# Altium footprint library goldpin_pcb.PcbLib: 235 footprints (part 7 of 15)
Each footprint in its own frame and in the unit in brackets; x right, y up, seen from the top. Pads: shape width x height; smd on the part's side, far side on the other; paste and mask are expansions set on the pad; w line width, h text height; cw(c..) or ccw(c..) is an arc to the next point about the centre after c.
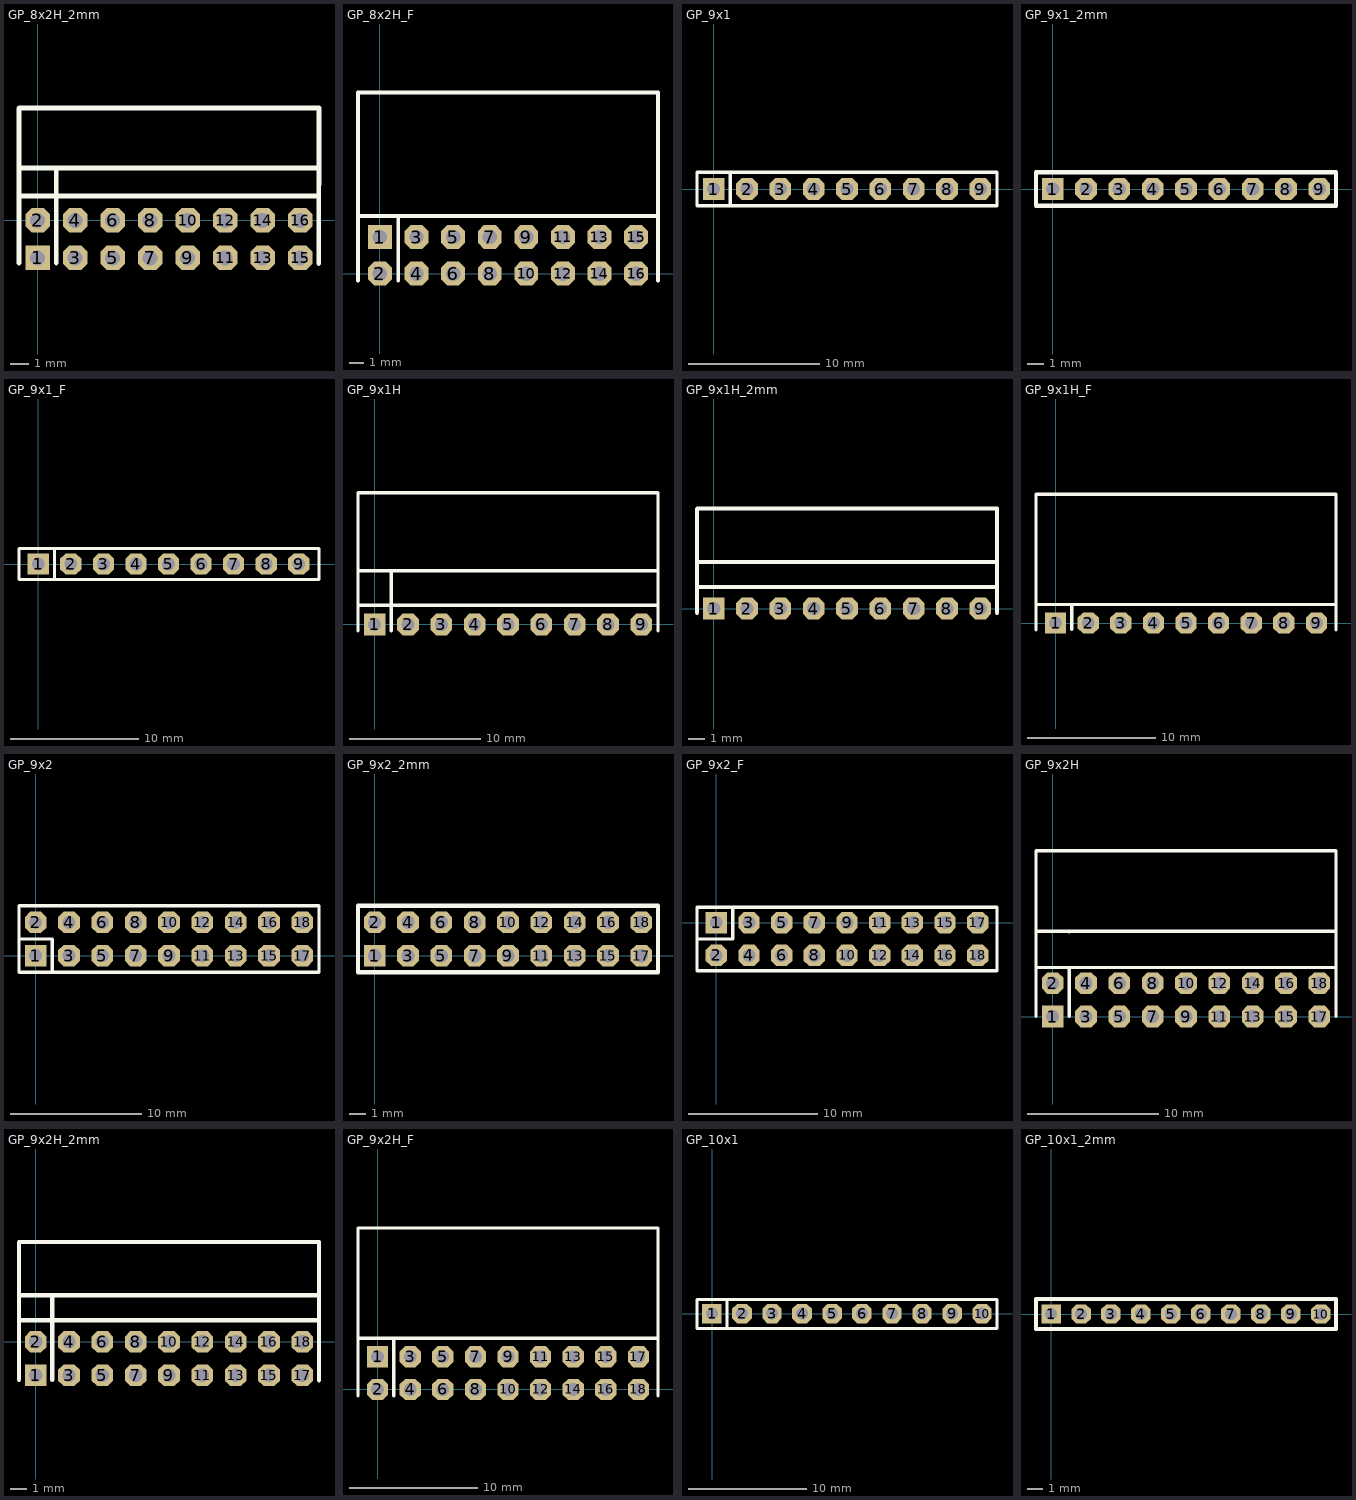
[diagram p6: the footprints below, top view; thin cyan lines are the x and y axes]

## GP_8x2H_2mm [mm]
height 4.45
pads (16):
  rect 1.3x1.3 hole 0.8: 1(0,-2)
  oct 1.3x1.3 hole 0.8: 2(0,0) 3(2,-2) 4(2,0) 5(4,-2) 6(4,0) 7(6,-2) 8(6,0) 9(8,-2) 10(8,0) 11(10,-2) 12(10,0) 13(12,-2) 14(12,0) 15(14,-2) 16(14,0)
Top Overlay:
  lines w0.254: -1,-2.275 -1,1.822 -1,5.973 ; -1,1.3 15,1.3 ; -1,2.8 15.006,2.8 ; 0.99,-2.275 0.99,2.775 ; 15,-2.3 15.01,5.975
  lines w0.256: -1,5.973 -0.973,6 15.01,6
3D body: height 3.97, standoff -3.02, extent -1.025,-2.261 14.975,5.961

## GP_8x2H_F [mil]
pads (16):
  rect 65x65 hole 39.37: 1(0,100)
  oct 65x65 hole 39.37: 2(0,0) 3(100,100) 4(100,0) 5(200,100) 6(200,0) 7(300,100) 8(300,0) 9(400,100) 10(400,0) 11(500,100) 12(500,0) 13(600,100) 14(600,0) 15(700,100) 16(700,0)
Top Overlay:
  lines w10: -60,-20 -60,495 760,495 760,-20 ; -60,157.24 760,157.24 ; 50,-20 50,157.24
3D body: height 197.89, standoff -97.11, extent -59.06,-10.87 760.94,492.13

## GP_9x1 [mil]
pads (9):
  rect 65x65 hole 39.37: 1(0,0)
  oct 65x65 hole 39.37: 2(100,0) 3(200,0) 4(300,0) 5(400,0) 6(500,0) 7(600,0) 8(700,0) 9(800,0)
Top Overlay:
  lines w10: 50,-50 50,45 ; -50,-50 850,-50 850,50 -50,50 -50,-50
3D body: height 330, standoff -115, extent -50,-50 850,50

## GP_9x1_2mm [mm]
height 4.45
pads (9):
  rect 1.3x1.3 hole 0.8: 1(0,0)
  oct 1.3x1.3 hole 0.8: 2(2,0) 3(4,0) 4(6,0) 5(8,0) 6(10,0) 7(12,0) 8(14,0) 9(16,0)
Top Overlay:
  lines w0.254: -1,-1 -1,1 17,1 17,-1 -1,-1
3D body: height 5.51, standoff -2.69, extent -1,-0.99 17,0.991

## GP_9x1_F [mil]
pads (9):
  rect 65x65 hole 39.37: 1(0,0)
  oct 65x65 hole 39.37: 2(100,0) 3(200,0) 4(300,0) 5(400,0) 6(500,0) 7(600,0) 8(700,0) 9(800,0)
Top Overlay:
  lines w10: 50,-47.24 50,45 ; -59.06,-47.24 -59.06,47.24 862.2,47.24 862.2,-47.24 -59.06,-47.24
3D body: height 335, standoff -104, extent -60,-47.5 860,47.5

## GP_9x1H [mil]
pads (9):
  rect 65x65 hole 39.37: 1(0,0)
  oct 65x65 hole 39.37: 2(100,0) 3(200,0) 4(300,0) 5(400,0) 6(500,0) 7(600,0) 8(700,0) 9(800,0)
Top Overlay:
  lines w10: -50,-19.68 -50,80.31 -50,395 850,395 850,-19.68 ; -50,57.24 850,57.24 ; -50,160.51 850,160.51 ; 50,-19.68 50,80.31 50,160
3D body: height 120, standoff -90, extent -50,-10 850,392.5

## GP_9x1H_2mm [mm]
height 4.45
pads (9):
  rect 1.3x1.3 hole 0.8: 1(0,0)
  oct 1.3x1.3 hole 0.8: 2(2,0) 3(4,0) 4(6,0) 5(8,0) 6(10,0) 7(12,0) 8(14,0) 9(16,0)
Top Overlay:
  lines w0.254: -1,-0.25 -1,1.822 -1,5.973 ; -1,1.3 17,1.3 ; -1,2.8 17,2.8
  lines w0.256: -1,5.973 -0.973,6 17,6 17,-0.25
3D body: height 1.99, standoff -3.04, extent -1,-0.25 17,5.973

## GP_9x1H_F [mil]
pads (9):
  rect 65x65 hole 39.37: 1(0,0)
  oct 65x65 hole 39.37: 2(100,0) 3(200,0) 4(300,0) 5(400,0) 6(500,0) 7(600,0) 8(700,0) 9(800,0)
Top Overlay:
  lines w10: -60,-20 -60,395 860,395 860,-20 ; -60,57.24 860,57.24 ; 50,-19.68 50,57.24
3D body: height 96.71, standoff -98.29, extent -60,-10 860,393

## GP_9x2 [mil]
pads (18):
  rect 65x65 hole 39.37: 1(0,0)
  oct 65x65 hole 39.37: 2(0,100) 3(100,0) 4(100,100) 5(200,0) 6(200,100) 7(300,0) 8(300,100) 9(400,0) 10(400,100) 11(500,0) 12(500,100) 13(600,0) 14(600,100) 15(700,0) 16(700,100) 17(800,0) 18(800,100)
Top Overlay:
  lines w10: -50,50 50,50 50,-50 ; -50,-50 850,-50 850,150 -50,150 -50,-50
3D body: height 330, standoff -115, extent -50,-50 850,150

## GP_9x2_2mm [mm]
height 4.45
pads (18):
  rect 1.3x1.3 hole 0.8: 1(0,0)
  oct 1.3x1.3 hole 0.8: 2(0,2) 3(2,0) 4(2,2) 5(4,0) 6(4,2) 7(6,0) 8(6,2) 9(8,0) 10(8,2) 11(10,0) 12(10,2) 13(12,0) 14(12,2) 15(14,0) 16(14,2) 17(16,0) 18(16,2)
Top Overlay:
  lines w0.254: -1,-1 -1,2.999 17,2.999 17,-1 -1,-1
3D body: height 6.51, standoff -1.69, extent -1,-0.968 17,2.969

## GP_9x2_F [mil]
pads (18):
  rect 65x65 hole 39.37: 1(0,0)
  oct 65x65 hole 39.37: 2(0,-100) 3(100,0) 4(100,-100) 5(200,0) 6(200,-100) 7(300,0) 8(300,-100) 9(400,0) 10(400,-100) 11(500,0) 12(500,-100) 13(600,0) 14(600,-100) 15(700,0) 16(700,-100) 17(800,0) 18(800,-100)
Top Overlay:
  lines w10: -59.06,-50 50,-50 50,47.51 ; 858.27,-147.49 -59.06,-147.49 -59.06,47.51 858.27,47.51 ; 859.06,-147.51 859.06,47.49
3D body: height 335, standoff -104, extent -60,-147.5 860,47.5

## GP_9x2H [mil]
pads (18):
  rect 65x65 hole 39.37: 1(0,0)
  oct 65x65 hole 39.37: 2(0,100) 3(100,0) 4(100,100) 5(200,0) 6(200,100) 7(300,0) 8(300,100) 9(400,0) 10(400,100) 11(500,0) 12(500,100) 13(600,0) 14(600,100) 15(700,0) 16(700,100) 17(800,0) 18(800,100)
Top Overlay:
  lines w10: -50,0 -50,180.31 -50,497.64 850,497.64 850,0 ; -50,147.24 850,147.24 ; -50,255.51 850,255.51 ; 49.21,255.51 50,254.72 ; 50,0 50,147.24
3D body: height 220, standoff -90, extent -50,-12.5 850,490

## GP_9x2H_2mm [mm]
height 4.45
pads (18):
  rect 1.3x1.3 hole 0.8: 1(0,-2)
  oct 1.3x1.3 hole 0.8: 2(0,0) 3(2,-2) 4(2,0) 5(4,-2) 6(4,0) 7(6,-2) 8(6,0) 9(8,-2) 10(8,0) 11(10,-2) 12(10,0) 13(12,-2) 14(12,0) 15(14,-2) 16(14,0) 17(16,-2) 18(16,0)
Top Overlay:
  lines w0.254: -1,-2.275 -1,1.822 -1,5.973 ; -1,1.3 17,1.3 ; -1,2.8 17,2.8 ; 0.99,-2.275 0.99,2.775 ; 17,-2.3 17,6
  lines w0.256: -1,5.973 -0.973,6 17,6
3D body: height 3.97, standoff -3.02, extent -1.025,-2.261 16.975,5.961

## GP_9x2H_F [mil]
pads (18):
  rect 65x65 hole 39.37: 1(0,100)
  oct 65x65 hole 39.37: 2(0,0) 3(100,100) 4(100,0) 5(200,100) 6(200,0) 7(300,100) 8(300,0) 9(400,100) 10(400,0) 11(500,100) 12(500,0) 13(600,100) 14(600,0) 15(700,100) 16(700,0) 17(800,100) 18(800,0)
Top Overlay:
  lines w10: -60,-20 -60,495 860,495 860,-20 ; -60,157.24 860,157.24 ; 50,-20 50,157.24
3D body: height 197.89, standoff -97.11, extent -59.06,-10.87 860.94,492.13

## GP_10x1 [mil]
pads (10):
  rect 65x65 hole 39.37: 1(0,0)
  oct 65x65 hole 39.37: 2(100,0) 3(200,0) 4(300,0) 5(400,0) 6(500,0) 7(600,0) 8(700,0) 9(800,0) 10(900,0)
Top Overlay:
  lines w10: 50,-50 50,47.24 ; -50,-50 -50,47.24 950,47.24 950,-50 -50,-50
3D body: height 330, standoff -115, extent -50,-50 950,50

## GP_10x1_2mm [mm]
height 4.45
pads (10):
  rect 1.3x1.3 hole 0.8: 1(0,0)
  oct 1.3x1.3 hole 0.8: 2(2,0) 3(4,0) 4(6,0) 5(8,0) 6(10,0) 7(12,0) 8(14,0) 9(16,0) 10(18,0)
Top Overlay:
  lines w0.254: -1,-1 -1,1 19,1 19,-1 -1,-1
3D body: height 5.51, standoff -2.69, extent -1,-0.99 19,0.991